# Altium footprint library Miscellaneous Devices.PcbLib: 277 footprints (part 3 of 18)
Each footprint in its own frame and in the unit in brackets; x right, y up, seen from the top. Pads: shape width x height; smd on the part's side, far side on the other; paste and mask are expansions set on the pad; w line width, h text height; cw(c..) or ccw(c..) is an arc to the next point about the centre after c.
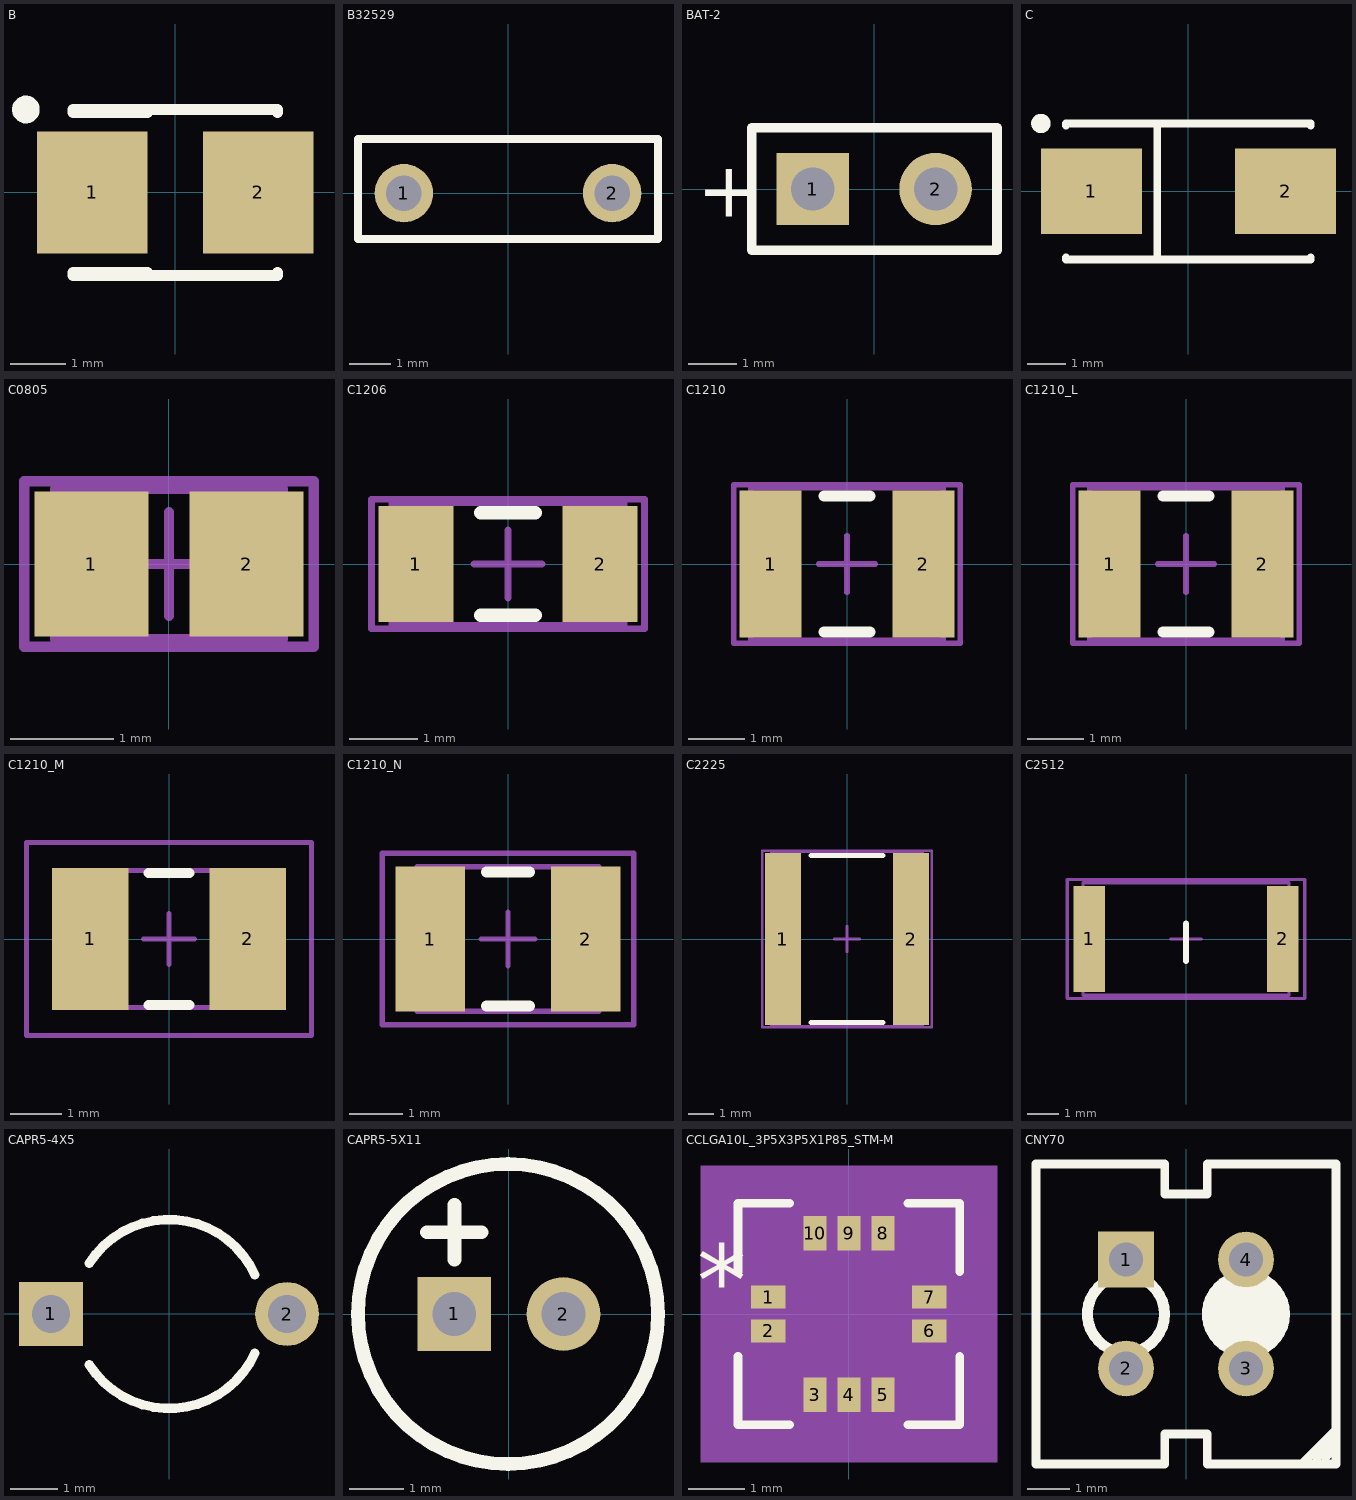
[diagram p2: the footprints below, top view; thin cyan lines are the x and y axes]

## B [mm] "Capacitor, SM Tantalum; Body 3.5 x 2.8 mm (LxW typ)"
height 2.1
pads (2):
  rect 2x2.2 smd: 1(-1.5,0) 2(1.5,0)
Top Overlay:
  circle w0.25: c-2.7,1.5 r0.125
  lines w0.2: -1.85,-1.5 1.85,-1.5 1.85,-1.45 ; -1.85,-1.45 -0.5,-1.45 ; -1.85,1.45 -0.5,1.45 ; -1.85,1.5 1.85,1.5 1.85,1.45
3D body "User Library-QT02752.STEP": height 1.85, standoff -0.06, extent -1.831,-1.4 1.832,1.4

## B32529 [mm] "Axial Device, Thru-Hole; 2 Leads; 0.3 in Pin Spacing"
height 1.524
pads (2):
  round 1.4 hole 0.85: 1(-2.5,0) 2(2.5,0)
Top Overlay:
  lines w0.2: -2.769,0 -2.54,0 ; -3.6,-1.1 -3.6,1.3 3.6,1.3 3.6,0 3.6,-1.1 -3.6,-1.1
3D body "User Library-B32529-2_5X6_5X7_2.STEP": height 6.5, standoff -3, extent -3.6,-1.15 3.6,1.35

## BAT-2 [mm] "Battery; 2 Leads"
pads (2):
  rect 1.5x1.5 hole 0.9: 1(-1.27,0)
  round 1.5 hole 0.9: 2(1.27,0)
Top Overlay:
  lines w0.2: -2.54,-1.27 2.54,-1.27 2.54,1.27 -2.54,1.27 -2.54,-1.27
  text "+" at -3.67,-0.577 h1.15

## C [mm] "Capacitor, SM Tantalum; Body 6.0 x 3.2 mm (LxW typ)"
height 2.8
pads (2):
  rect 2.6x2.2 smd: 1(-2.5,0) 2(2.5,0)
Top Overlay:
  circle w0.25: c-3.8,1.75 r0.125
  lines w0.2: -3.15,-1.7 -3.15,-1.75 3.15,-1.75 3.15,-1.7 ; -3.15,1.7 -3.15,1.75 3.15,1.75 3.15,1.7 ; -0.8,-1.75 -0.8,1.75
3D body "User Library-C_case.STEP": height 2.7, standoff 0, extent -3.05,-1.675 3.05,1.675

## C0805 [mm] "Chip Capacitor, Body 2.0x1.3mm, IPC High Density"
height 1.4
pads (2):
  rect 1.1x1.4 smd: 1(-0.75,0) 2(0.75,0)
Mechanical 13:
  lines w0.1: -1.1,-0.725 1.1,-0.725 1.1,0.725 -1.1,0.725 -1.1,-0.725
Mechanical 15:
  lines w0.1: -0.5,0 0.5,0 ; 0,-0.5 0,0.5 ; -1.4,-0.8 1.4,-0.8 1.4,0.8 -1.4,0.8 -1.4,-0.8
3D body "SW3DPS-CAPACITOR 0805-DEFAULT.STEP": height 0.73, standoff -0.03, extent -1,-0.655 1,0.655

## C1206 [mm] "Chip Capacitor, Body 3.2x1.6mm, IPC High Density"
height 1.3
pads (2):
  rect 1.1x1.7 smd: 1(-1.35,0) 2(1.35,0)
Top Overlay:
  lines w0.2: -0.4,-0.75 0.4,-0.75 ; -0.4,0.75 0.4,0.75
Mechanical 13:
  lines w0.1: -1.7,-0.9 -1.7,0.9 1.7,0.9 1.7,-0.9 -1.7,-0.9
Mechanical 15:
  lines w0.1: -0.5,0 0.5,0 ; 0,-0.5 0,0.5 ; -2,-0.95 -2,0.95 2,0.95 2,-0.95 -2,-0.95
3D body "SW3dPS-1206 SMD Capacitor.STEP": height 1, standoff 0, extent -1.6,-0.8 1.6,0.8

## C1210 [mm] "Chip Capacitor, Body 3.2x2.5mm, IPC High Density"
height 1.3
pads (2):
  rect 1.1x2.6 smd: 1(-1.35,0) 2(1.35,0)
Top Overlay:
  lines w0.2: -0.4,-1.2 0.4,-1.2 ; -0.4,1.2 0.4,1.2
Mechanical 13:
  lines w0.1: -1.7,-1.35 -1.7,1.35 1.7,1.35 1.7,-1.35 -1.7,-1.35
Mechanical 15:
  lines w0.1: -0.5,0 0.5,0 ; 0,-0.5 0,0.5 ; -2,-1.4 -2,1.4 2,1.4 2,-1.4 -2,-1.4
3D body: height 1.3, standoff 0, extent -1.7,-1.35 1.7,1.35

## C1210_L [mm] "Chip Capacitor, Body 3.2x2.5mm, IPC High Density"
height 1.5
pads (2):
  rect 1.1x2.6 smd: 1(-1.35,0) 2(1.35,0)
Top Overlay:
  lines w0.2: -0.4,-1.2 0.4,-1.2 ; -0.4,1.2 0.4,1.2
Mechanical 13:
  lines w0.1: -1.7,-1.35 -1.7,1.35 1.7,1.35 1.7,-1.35 -1.7,-1.35
Mechanical 15:
  lines w0.1: -0.5,0 0.5,0 ; 0,-0.5 0,0.5 ; -2,-1.4 -2,1.4 2,1.4 2,-1.4 -2,-1.4
3D body: height 1.5, standoff 0, extent -1.7,-1.35 1.7,1.35

## C1210_M [mm] "Chip Capacitor, Body 3.2x2.5mm, IPC Low Density"
height 1.5
pads (2):
  rect 1.5x2.8 smd: 1(-1.55,0) 2(1.55,0)
Top Overlay:
  lines w0.2: -0.4,-1.3 0.4,-1.3 ; -0.4,1.3 0.4,1.3
Mechanical 13:
  lines w0.1: -1.7,-1.35 1.7,-1.35 1.7,1.35 -1.7,1.35 -1.7,-1.35
Mechanical 15:
  lines w0.1: -0.5,0 0.5,0 ; 0,-0.5 0,0.5 ; -2.8,-1.9 2.8,-1.9 2.8,1.9 -2.8,1.9 -2.8,-1.9
3D body: height 1.5, standoff 0, extent -1.7,-1.35 1.7,1.35

## C1210_N [mm] "Chip Capacitor, Body 3.2x2.5mm, IPC Medium Density"
height 1.5
pads (2):
  rect 1.3x2.7 smd: 1(-1.45,0) 2(1.45,0)
Top Overlay:
  lines w0.2: -0.4,-1.25 0.4,-1.25 ; -0.4,1.25 0.4,1.25
Mechanical 13:
  lines w0.1: -1.7,-1.35 -1.7,1.35 1.7,1.35 1.7,-1.35 -1.7,-1.35
Mechanical 15:
  lines w0.1: -0.5,0 0.5,0 ; 0,-0.5 0,0.5 ; -2.35,-1.6 -2.35,1.6 2.35,1.6 2.35,-1.6 -2.35,-1.6
3D body: height 1.5, standoff 0, extent -1.7,-1.35 1.7,1.35

## C2225 [mm] "Chip Capacitor, Body 5.7x6.4mm, IPC High Density"
height 1.4
pads (2):
  rect 1.4x6.7 smd: 1(-2.5,0) 2(2.5,0)
Top Overlay:
  lines w0.2: -1.4,-3.25 1.4,-3.25 ; -1.4,3.25 1.4,3.25
Mechanical 13:
  lines w0.1: -2.95,-3.4 -2.95,3.4 2.95,3.4 2.95,-3.4 -2.95,-3.4
Mechanical 15:
  lines w0.1: -0.5,0 0.5,0 ; 0,-0.5 0,0.5 ; -3.3,-3.45 -3.3,3.45 3.3,3.45 3.3,-3.45 -3.3,-3.45
3D body: height 1.4, standoff 0, extent -2.95,-3.4 2.95,3.4

## C2512 [mm] "Chip Capacitor, Body 2.54x1.27mm, IPC High Density"
height 1.3
pads (2):
  rect 1x3.4 smd: 1(-3.1,0) 2(3.1,0)
Top Overlay:
  lines w0.2: 0,-0.7 0,0.5
Mechanical 13:
  lines w0.1: -3.3,-1.8 -3.3,1.8 3.3,1.8 3.3,-1.8 -3.3,-1.8
Mechanical 15:
  lines w0.1: -0.5,0 0.5,0 ; 0,-0.5 0,0.5 ; -3.8,-1.9 -3.8,1.9 3.8,1.9 3.8,-1.9 -3.8,-1.9
3D body: height 1.3, standoff 0, extent -3.3,-1.8 3.4,1.8

## CAPR5-4X5 [mm] "Capacitor; 2 Leads"
height 12
pads (2):
  rect 1.35x1.35 hole 0.8: 1(-2.5,0)
  round 1.35 hole 0.8: 2(2.5,0)
Top Overlay:
  lines w0.2: -1.687,-1.075 ccw(c0,0) 1.819,-0.832 ; -1.687,1.075 cw(c0,0) 1.819,0.832

## CAPR5-5X11 [mm] "Capacitor; 2 Leads"
height 12
pads (2):
  rect 1.35x1.35 hole 0.8: 1(-1,0)
  round 1.35 hole 0.8: 2(1,0)
Top Overlay:
  circle w0.254: c-0.017,0 r2.75
  lines w0.254: -1.5,1.5 -0.5,1.5 ; -1,1 -1,2
3D body: height 11, standoff 0, extent -2.766,-2.749 2.733,2.749

## CCLGA10L_3P5X3P5X1P85_STM-M [mil]
pads (10):
  rect 23.94x15.97 smd paste+0 mask+0: 1(-56,11.81) 2(-56,-11.81) 6(56,-11.81) 7(56,11.81)
  rect 15.97x23.94 smd paste+0 mask+0: 3(-23.62,-56) 4(0,-56) 5(23.62,-56) 8(23.62,56) 9(0,56) 10(-23.62,56)
Top Overlay:
  lines w6: -77,-29.28 -77,-77 -41.1,-77 ; -77,29.28 -77,77 -41.1,77 ; 41.1,-77 77,-77 77,-29.28 ; 41.1,77 77,77 77,29.28
  text "*" at -105.47,-1.38 h50
Mechanical 5:
  region: 102.97,-102.97 -102.97,-102.97 -102.97,102.97 102.97,102.97
Mechanical 13:
  lines w1: -72,22 -22,72 ; -72,-72 72,-72 72,72 -72,72 -72,-72 ; -72,-18.81 -72,-4.81 -66,-4.81 -66,-18.81 -72,-18.81 ; -72,4.81 -72,18.81 -66,18.81 -66,4.81 -72,4.81 ; -30.62,-72 -16.62,-72 -16.62,-66 -30.62,-66 -30.62,-72 ; -30.62,66 -16.62,66 -16.62,72 -30.62,72 -30.62,66 ; -7,-72 7,-72 7,-66 -7,-66 -7,-72 ; -7,66 7,66 7,72 -7,72 -7,66 ; 16.62,-72 30.62,-72 30.62,-66 16.62,-66 16.62,-72 ; 16.62,66 30.62,66 30.62,72 16.62,72 16.62,66 ; 66,-18.81 72,-18.81 72,-4.81 66,-4.81 66,-18.81 ; 66,4.81 72,4.81 72,18.81 66,18.81 66,4.81
  text "*" at -56.53,-1.38 h50
Mechanical 15:
  region: -51.61,-92 -92,-92 -92,-39.8 -92,39.8 -92,92 -51.61,92 51.61,92 92,92 92,39.8 92,-39.8 92,-92 51.61,-92
  lines w6: -92,-92 -92,-39.8 -92,39.8 -92,92 -51.61,92 51.61,92 92,92 92,39.8 92,-39.8 92,-92 51.61,-92 -51.61,-92 -92,-92
3D body: height 10, standoff 0, extent -63.98,-64.96 62.99,63.98

## CNY70 [mm] "Axial Device, Thru-Hole; 2 Leads; 0.3 in Pin Spacing"
height 1.524
pads (4):
  rect 1.3x1.3 hole 0.8: 1(-1.4,1.27)
  round 1.3 hole 0.8: 2(-1.4,-1.27) 3(1.4,-1.27) 4(1.4,1.27)
Top Overlay:
  circle w0.254: c1.4,0 r0.9
  circle w0.254: c-1.4,0 r0.9
  lines w0.2: -0.5,-3.5 -3.5,-3.5 -3.5,3.5 -0.5,3.5 -0.5,2.8 ; -0.5,-3.45 -0.5,-2.8 0.45,-2.8 ; -0.45,2.8 0.5,2.8 0.5,3.45 ; 0.5,-2.8 0.5,-3.5 3.5,-3.5 3.5,3.5 0.5,3.5 ; 2.7,-3.5 3.5,-2.7 ; 3.05,-3.35 3.4,-3 ; 3.25,-3.35 3.4,-3.2
  lines w0.254: 0.5,-0.1 2.2,-0.1 ; 0.6,-0.3 2.1,-0.3 ; 0.6,0.1 2.1,0.1 ; 0.7,0.3 2.2,0.3 ; 0.8,-0.5 2,-0.5 ; 0.8,0.5 2.1,0.5 ; 1.3,-0.7 1.3,0.8 ; 1.7,-0.6 0.9,-0.6 0.9,0.7 1.8,0.7 1.8,-0.7
3D body "User Library-cny70-1.step": height 6, standoff -5.75, extent -3.5,-3.6 3.5,3.4